# Altium schematic symbol library FPGA_Xilinx_Virtex5.SchLib: 41 symbols (part 6 of 27) (continued)
## XC5VLX30T-FF665 (continued)
part E pins: AA10 IO_L2P_A23_2 (io), AA12 IO_L4N_VREF_FOE_B_MOSI_2 (io), AA13 IO_L6P_D7_2 (io), AA14 IO_L6N_D6_2 (io), AA15 IO_L9N_D0_FS0_2 (io), AA16 VCCO_2 (power), AA17 IO_L5P_FWE_B_2 (io), AA18 IO_L3P_A21_2 (io), AA19 IO_L1N_CC_A24_2 (io), AD17 VCCO_2 (power), D13 IO_L2N_GC_VRP_3 (io), D14 IO_L2P_GC_VRN_3 (io), D15 IO_L0P_CC_GC_3 (io), D16 IO_L1P_CC_GC_3 (io), D17 VCCO_3 (power), D18 IO_L3N_GC_3 (io), E10 IO_L8P_GC_3 (io), E11 IO_L6N_GC_3 (io), E12 IO_L4N_GC_VREF_3 (io), E13 IO_L4P_GC_3 (io), E15 IO_L0N_CC_GC_3 (io), E16 IO_L1N_CC_GC_3 (io), E17 IO_L3P_GC_3 (io), E18 IO_L5P_GC_3 (io), E20 IO_L7P_GC_3 (io), E21 IO_L7N_GC_3 (io), F10 IO_L8N_GC_3 (io), F12 IO_L6P_GC_3 (io), F19 IO_L5N_GC_3 (io), F20 IO_L9P_GC_3 (io), G18 VCCO_3 (power), G21 IO_L9N_GC_3 (io), W11 IO_L0P_CC_RS1_2 (io), W14 IO_L8N_D2_FS2_2 (io), W16 IO_L7N_D4_2 (io), Y10 IO_L0N_CC_RS0_2 (io), Y11 IO_L2N_A22_2 (io), Y12 IO_L4P_FCS_B_2 (io), Y13 IO_L8P_D3_2 (io), Y15 IO_L9P_D1_FS1_2 (io), Y16 IO_L7P_D5_2 (io), Y17 IO_L5N_CSO_B_2 (io), Y18 IO_L3N_A20_2 (io), Y20 IO_L1P_CC_A25_2 (io)
part F pins: AA20 IO_L0N_GC_D14_4 (io), AB10 IO_L1P_GC_D13_4 (io), AB11 IO_L1N_GC_D12_4 (io), AB12 IO_L3N_GC_D8_4 (io), AB13 VCCO_4 (power), AB14 IO_L7P_GC_VRN_4 (io), AB15 IO_L9P_CC_GC_4 (io), AB16 IO_L8N_CC_GC_4 (io), AB17 IO_L6N_GC_4 (io), AB19 IO_L4P_GC_4 (io), AB20 IO_L2N_GC_D10_4 (io), AB21 IO_L2P_GC_D11_4 (io), AC11 IO_L3P_GC_D9_4 (io), AC12 IO_L5P_GC_4 (io), AC13 IO_L5N_GC_4 (io), AC14 IO_L7N_GC_VRP_4 (io), AC16 IO_L9N_CC_GC_4 (io), AC17 IO_L8P_CC_GC_4 (io), AC18 IO_L6P_GC_4 (io), AC19 IO_L4N_GC_VREF_4 (io), AE14 VCCO_4 (power), Y21 IO_L0P_GC_D15_4 (io)
part G pins: H2 MGTTXP0_112 (io), J1 MGTRXP0_112 (io), J2 MGTTXN0_112 (io), K1 MGTRXN0_112 (io), K3 MGTREFCLKN_112 (io), K4 MGTREFCLKP_112 (io), L1 MGTRXN1_112 (io), M1 MGTRXP1_112 (io), M2 MGTTXN1_112 (io), N2 MGTTXP1_112 (io), P2 MGTTXP0_114 (io), R1 MGTRXP0_114 (io), R2 MGTTXN0_114 (io), T1 MGTRXN0_114 (io), T3 MGTREFCLKN_114 (io), T4 MGTREFCLKP_114 (io), U1 MGTRXN1_114 (io), V1 MGTRXP1_114 (io), V2 MGTTXN1_114 (io), W2 MGTTXP1_114 (io)
part H pins: AA1 MGTRXP0_118 (io), AA2 MGTTXN0_118 (io), AB1 MGTRXN0_118 (io), AB3 MGTREFCLKN_118 (io), AB4 MGTREFCLKP_118 (io), AC1 MGTRXN1_118 (io), AD1 MGTRXP1_118 (io), AD2 MGTTXN1_118 (io), AE2 MGTTXP1_118 (io), B2 MGTTXP0_116 (io), C1 MGTRXP0_116 (io), C2 MGTTXN0_116 (io), D1 MGTRXN0_116 (io), D3 MGTREFCLKN_116 (io), D4 MGTREFCLKP_116 (io), E1 MGTRXN1_116 (io), F1 MGTRXP1_116 (io), F2 MGTTXN1_116 (io), G2 MGTTXP1_116 (io), Y2 MGTTXP0_118 (io)
part I pins: AA3 MGTAVTTRX_118 (power), AC3 MGTAVCC_118 (power), AC4 MGTAVCC_118 (power), AD3 MGTAVCCPLL_118 (power), AE3 MGTAVTTTX_118 (power), B3 MGTAVTTTX_116 (power), C3 MGTAVTTRX_116 (power), E3 MGTAVCC_116 (power), E4 MGTAVCC_116 (power), F3 MGTAVCCPLL_116 (power), G3 MGTAVTTTX_116 (power), H3 MGTAVTTTX_112 (power), J3 MGTAVTTRX_112 (power), L3 MGTAVCC_112 (power), L4 MGTAVCC_112 (power), M3 MGTAVCCPLL_112 (power), N3 MGTAVTTTX_112 (power), P3 MGTAVTTTX_114 (power), P4 MGTRREF_112 (power), P5 MGTAVTTRXC (power), R3 MGTAVTTRX_114 (power), U3 MGTAVCC_114 (power), U4 MGTAVCC_114 (power), V3 MGTAVCCPLL_114 (power), W3 MGTAVTTTX_114 (power), Y3 MGTAVTTTX_118 (power)
part J pins: F11 VCCO_0 (power), H12 INIT_B_0 (io), J10 D_IN_0 (io), J11 CCLK_0 (io), J12 VCCO_0 (power), J20 PROGRAM_B_0 (io), K11 DONE_0 (io), K20 HSWAPEN_0 (io), L20 CS_B_0 (io), M20 RDWR_B_0 (io), N14 VREFN_0 (io), N15 VP_0 (io), P14 VN_0 (io), P15 VREFP_0 (io), R14 DXN_0 (io), R15 DXP_0 (io), T20 M0_0 (io), U12 D_OUT_BUSY_0 (io), U20 M2_0 (io), V11 TCK_0 (io), V12 TDO_0 (io), V13 TDI_0 (io), W13 TMS_0 (io), W20 M1_0 (io)
part K pins: A2 GND (power), A6 GND (power), A11 GND (power), A16 GND (power), A21 GND (power), A26 GND (power), AA4 GND (power), AA11 GND (power), AA21 GND (power), AA26 GND (power), AB2 GND (power), AB8 GND (power), AB18 GND (power), AC2 GND (power), AC5 GND (power), AC15 GND (power), AC25 GND (power), AD12 GND (power), AD22 GND (power), AE4 GND (power), AE9 GND (power), AE19 GND (power), AF2 GND (power), AF6 GND (power), AF11 GND (power), AF16 GND (power), AF21 GND (power), AF26 GND (power), B8 GND (power), B18 GND (power), C4 GND (power), C5 GND (power), C15 GND (power), C20 GND (power), C25 GND (power), D2 GND (power), D12 GND (power), D22 GND (power), E2 GND (power), E9 GND (power), E19 GND (power), F4 GND (power), F6 GND (power), F16 GND (power), F26 GND (power), G13 GND (power), G23 GND (power), H10 GND (power), H14 GND (power), H15 VCCINT (power), H16 GND (power), H17 VCCINT (power), H20 GND (power), J4 GND (power), J7 GND (power), J13 GND (power), J14 VCCINT (power), J15 GND (power), J16 VCCINT (power), J17 GND (power), J18 VCCINT (power), J19 VBATT_0 (power), K2 GND (power), K9 VCCAUX (power), K10 GND (power), K12 GND (power), K13 VCCINT (power), K14 GND (power), K15 VCCINT (power), K16 GND (power), K17 VCCINT (power), K18 GND (power), K19 VCCINT (power), K24 GND (power), L2 GND (power), L9 GND (power), L10 VCCINT (power), L11 GND (power), L12 VCCINT (power), L13 GND (power), L14 VCCINT (power), L15 GND (power), L16 VCCINT (power), L17 GND (power), L18 VCCINT (power), L19 GND (power), L21 GND (power), L26 GND (power), M4 GND (power), M8 GND (power), M9 VCCAUX (power), M10 GND (power), M11 VCCINT (power), M12 GND (power), M13 VCCINT (power), M14 AVSS_0 (power), M15 AVDD_0 (power), M16 GND (power), M17 VCCINT (power), M18 GND (power), M19 VCCAUX (power), N5 GND (power), N9 GND (power), N10 VCCINT (power), N11 GND (power), N12 VCCINT (power), N13 GND (power), N16 VCCINT (power), N17 GND (power), N18 VCCINT (power), N19 GND (power), N20 VCCAUX (power), N25 GND (power), P9 VCCAUX (power), P10 GND (power), P11 VCCINT (power), P12 GND (power), P13 VCCINT (power), P16 GND (power), P17 VCCINT (power), P18 GND (power), P19 VCCAUX (power), P22 GND (power), R4 GND (power), R9 GND (power), R10 VCCINT (power), R11 GND (power), R12 VCCINT (power), R13 GND (power), R16 VCCINT (power), R17 GND (power), R18 VCCINT (power), R19 GND (power), T2 GND (power), T6 GND (power), T9 VCCAUX (power), T10 GND (power), T11 VCCINT (power), T12 GND (power), T13 VCCINT (power), T14 GND (power), T15 VCCINT (power), T16 GND (power), T17 VCCINT (power), T18 GND (power), T19 VCCAUX (power), T21 GND (power), T26 GND (power), U2 GND (power), U8 VCCAUX (power), U9 GND (power), U10 VCCINT (power), U11 GND (power), U13 GND (power), U14 VCCINT (power), U15 GND (power), U16 VCCINT (power), U17 GND (power), U18 VCCINT (power), U19 GND (power), U23 GND (power), V4 GND (power), V5 GND (power), V10 GND (power), V14 GND (power), V15 VCCINT (power), V16 GND (power), V17 VCCINT (power), V18 GND (power), V19 VCCAUX (power), V20 GND (power), W7 GND (power), W10 VCCAUX (power), W12 GND (power), W15 GND (power), W17 GND (power), W18 VCCINT (power), W19 GND (power), Y9 GND (power), Y14 GND (power), Y19 VCCAUX (power), Y24 GND (power)

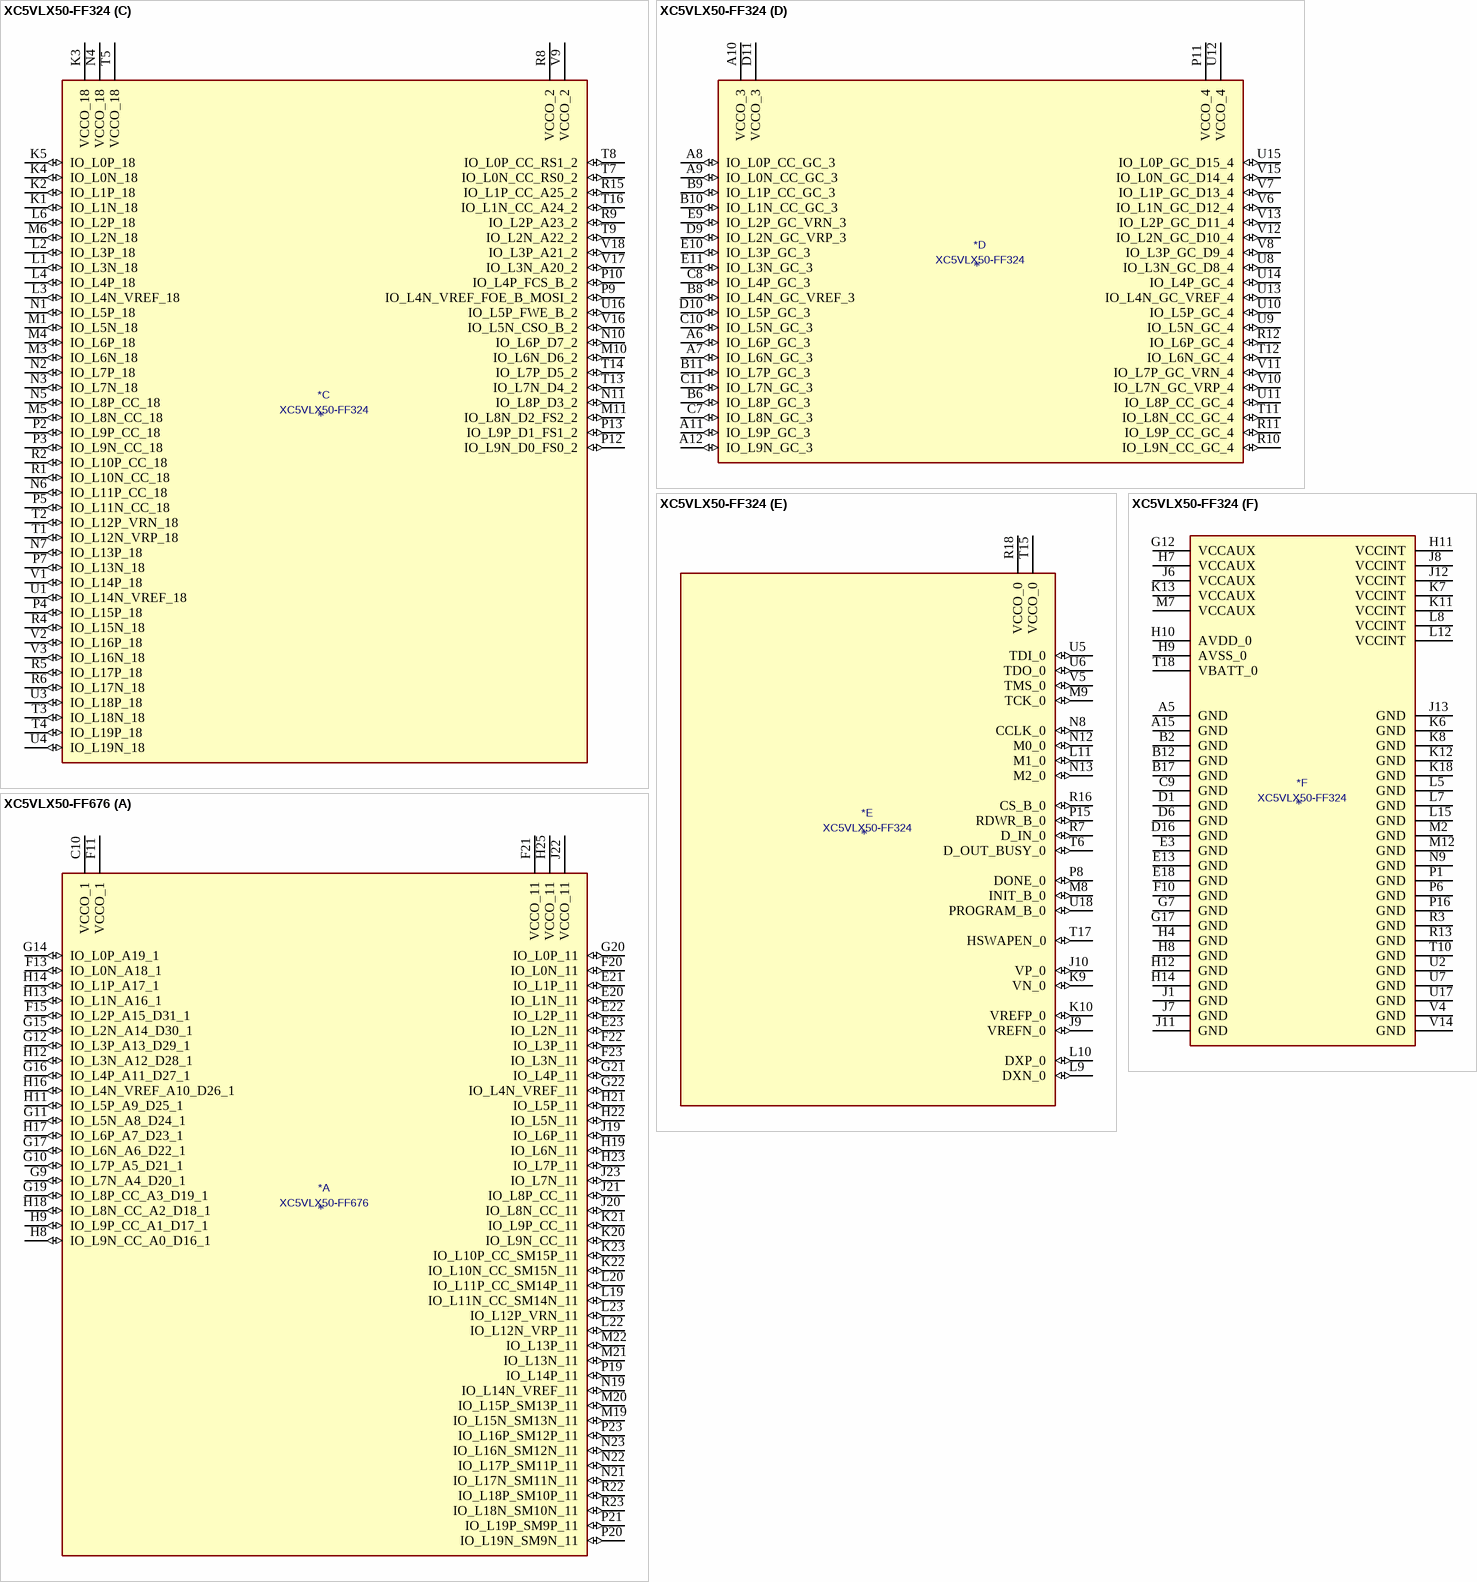
[diagram p35: symbols XC5VLX50-FF324 to XC5VLX50-FF676]

## XC5VLX50-FF324
designator *  value XC5VLX50-FF324
ki_keywords: FPGA; ki_description: Virtex 5 LX 50 XC5VLX50-FF324
part A pins: A13 IO_L1P_11 (io), A14 IO_L1N_11 (io), A16 IO_L3N_11 (io), A17 IO_L5P_11 (io), A18 IO_L5N_11 (io), B7 VCCO_1 (power), B13 IO_L6N_11 (io), B14 IO_L2P_11 (io), B15 IO_L2N_11 (io), B16 IO_L3P_11 (io), B18 IO_L7P_11 (io), C6 IO_L9N_CC_A0_D16_1 (io), C12 IO_L4P_A11_D27_1 (io), C13 IO_L6P_11 (io), C14 VCCO_11 (power), C15 IO_L0P_11 (io), C16 IO_L0N_11 (io), C17 IO_L7N_11 (io), C18 IO_L12N_VRP_11 (io), D7 IO_L9P_CC_A1_D17_1 (io), D8 IO_L7P_A5_D21_1 (io), D12 IO_L2N_A14_D30_1 (io), D13 IO_L4N_VREF_A10_D26_1 (io), D14 IO_L4P_11 (io), D15 IO_L11P_CC_SM14P_11 (io), D17 IO_L10N_CC_SM15N_11 (io), D18 IO_L12P_VRN_11 (io), E7 IO_L7N_A4_D20_1 (io), E8 VCCO_1 (power), E12 IO_L2P_A15_D31_1 (io), E14 IO_L4N_VREF_11 (io), E15 IO_L11N_CC_SM14N_11 (io), E16 IO_L9N_CC_11 (io), E17 IO_L10P_CC_SM15P_11 (io), F7 IO_L5N_A8_D24_1 (io), F8 IO_L3P_A13_D29_1 (io), F9 IO_L1N_A16_1 (io), F11 IO_L0P_A19_1 (io), F12 IO_L6P_A7_D23_1 (io), F13 IO_L6N_A6_D22_1 (io), F14 IO_L8P_CC_11 (io), F15 VCCO_11 (power), F16 IO_L9P_CC_11 (io), F17 IO_L14N_VREF_11 (io), F18 IO_L14P_11 (io), G8 IO_L5P_A9_D25_1 (io), G9 IO_L3N_A12_D28_1 (io), G10 IO_L1P_A17_1 (io), G11 IO_L0N_A18_1 (io), G13 IO_L8P_CC_A3_D19_1 (io), G14 IO_L8N_CC_11 (io), G15 IO_L13N_11 (io), G16 IO_L15N_SM13N_11 (io), G18 IO_L16N_SM12N_11 (io), H13 IO_L8N_CC_A2_D18_1 (io), H15 IO_L13P_11 (io), H16 IO_L15P_SM13P_11 (io), H17 IO_L17P_SM11P_11 (io), H18 IO_L16P_SM12P_11 (io), J14 IO_L19N_SM9N_11 (io), J15 IO_L19P_SM9P_11 (io), J16 VCCO_11 (power), J17 IO_L17N_SM11N_11 (io), J18 IO_L18N_SM10N_11 (io), K17 IO_L18P_SM10P_11 (io)
part B pins: A1 IO_L10P_CC_12 (io), A2 IO_L10N_CC_12 (io), A3 IO_L5P_12 (io), A4 IO_L3N_12 (io), B1 IO_L12N_VRP_12 (io), B3 IO_L5N_12 (io), B4 IO_L3P_12 (io), B5 IO_L1P_12 (io), C1 IO_L12P_VRN_12 (io), C2 IO_L9N_CC_12 (io), C3 IO_L7P_12 (io), C4 VCCO_12 (power), C5 IO_L1N_12 (io), D2 IO_L9P_CC_12 (io), D3 IO_L7N_12 (io), D4 IO_L2N_12 (io), D5 IO_L2P_12 (io), E1 IO_L14N_VREF_12 (io), E2 IO_L18P_12 (io), E4 IO_L4N_VREF_12 (io), E5 IO_L4P_12 (io), E6 IO_L0P_12 (io), F1 IO_L14P_12 (io), F2 IO_L18N_12 (io), F3 IO_L13N_12 (io), F4 IO_L11N_CC_12 (io), F5 VCCO_12 (power), F6 IO_L0N_12 (io), G1 IO_L19P_12 (io), G2 VCCO_12 (power), G3 IO_L13P_12 (io), G4 IO_L11P_CC_12 (io), G5 IO_L6P_12 (io), G6 IO_L6N_12 (io), H1 IO_L19N_12 (io), H2 IO_L17P_12 (io), H3 IO_L16P_12 (io), H5 IO_L8N_CC_12 (io), H6 IO_L8P_CC_12 (io), J2 IO_L17N_12 (io), J3 IO_L16N_12 (io), J4 IO_L15N_12 (io), J5 IO_L15P_12 (io), K14 IO_L2P_SM6P_13 (io), K15 IO_L0P_SM8P_13 (io), K16 IO_L1N_SM7N_13 (io), L13 IO_L4P_13 (io), L14 IO_L2N_SM6N_13 (io), L16 IO_L0N_SM8N_13 (io), L17 IO_L1P_SM7P_13 (io), L18 IO_L3N_SM5N_13 (io), M13 IO_L4N_VREF_13 (io), M14 IO_L6P_SM3P_13 (io), M15 IO_L8P_CC_SM1P_13 (io), M16 IO_L8N_CC_SM1N_13 (io), M17 VCCO_13 (power), M18 IO_L3P_SM5P_13 (io), N14 VCCO_13 (power), N15 IO_L6N_SM3N_13 (io), N16 IO_L9P_CC_SM0P_13 (io), N17 IO_L9N_CC_SM0N_13 (io), N18 IO_L5N_SM4N_13 (io), P17 IO_L7P_SM2P_13 (io), P18 IO_L5P_SM4P_13 (io), R17 IO_L7N_SM2N_13 (io)
part C pins: K1 IO_L1N_18 (io), K2 IO_L1P_18 (io), K3 VCCO_18 (power), K4 IO_L0N_18 (io), K5 IO_L0P_18 (io), L1 IO_L3N_18 (io), L2 IO_L3P_18 (io), L3 IO_L4N_VREF_18 (io), L4 IO_L4P_18 (io), L6 IO_L2P_18 (io), M1 IO_L5N_18 (io), M3 IO_L6N_18 (io), M4 IO_L6P_18 (io), M5 IO_L8N_CC_18 (io), M6 IO_L2N_18 (io), M10 IO_L6N_D6_2 (io), M11 IO_L8N_D2_FS2_2 (io), N1 IO_L5P_18 (io), N2 IO_L7P_18 (io), N3 IO_L7N_18 (io), N4 VCCO_18 (power), N5 IO_L8P_CC_18 (io), N6 IO_L11P_CC_18 (io), N7 IO_L13P_18 (io), N10 IO_L6P_D7_2 (io), N11 IO_L8P_D3_2 (io), P2 IO_L9P_CC_18 (io), P3 IO_L9N_CC_18 (io), P4 IO_L15P_18 (io), P5 IO_L11N_CC_18 (io), P7 IO_L13N_18 (io), P9 IO_L4N_VREF_FOE_B_MOSI_2 (io), P10 IO_L4P_FCS_B_2 (io), P12 IO_L9N_D0_FS0_2 (io), P13 IO_L9P_D1_FS1_2 (io), R1 IO_L10N_CC_18 (io), R2 IO_L10P_CC_18 (io), R4 IO_L15N_18 (io), R5 IO_L17P_18 (io), R6 IO_L17N_18 (io), R8 VCCO_2 (power), R9 IO_L2P_A23_2 (io), R15 IO_L1P_CC_A25_2 (io), T1 IO_L12N_VRP_18 (io), T2 IO_L12P_VRN_18 (io), T3 IO_L18N_18 (io), T4 IO_L19P_18 (io), T5 VCCO_18 (power), T7 IO_L0N_CC_RS0_2 (io), T8 IO_L0P_CC_RS1_2 (io), T9 IO_L2N_A22_2 (io), T13 IO_L7N_D4_2 (io), T14 IO_L7P_D5_2 (io), T16 IO_L1N_CC_A24_2 (io), U1 IO_L14N_VREF_18 (io), U3 IO_L18P_18 (io), U4 IO_L19N_18 (io), U16 IO_L5P_FWE_B_2 (io), V1 IO_L14P_18 (io), V2 IO_L16P_18 (io), V3 IO_L16N_18 (io), V9 VCCO_2 (power), V16 IO_L5N_CSO_B_2 (io), V17 IO_L3N_A20_2 (io), V18 IO_L3P_A21_2 (io)
part D pins: A6 IO_L6P_GC_3 (io), A7 IO_L6N_GC_3 (io), A8 IO_L0P_CC_GC_3 (io), A9 IO_L0N_CC_GC_3 (io), A10 VCCO_3 (power), A11 IO_L9P_GC_3 (io), A12 IO_L9N_GC_3 (io), B6 IO_L8P_GC_3 (io), B8 IO_L4N_GC_VREF_3 (io), B9 IO_L1P_CC_GC_3 (io), B10 IO_L1N_CC_GC_3 (io), B11 IO_L7P_GC_3 (io), C7 IO_L8N_GC_3 (io), C8 IO_L4P_GC_3 (io), C10 IO_L5N_GC_3 (io), C11 IO_L7N_GC_3 (io), D9 IO_L2N_GC_VRP_3 (io), D10 IO_L5P_GC_3 (io), D11 VCCO_3 (power), E9 IO_L2P_GC_VRN_3 (io), E10 IO_L3P_GC_3 (io), E11 IO_L3N_GC_3 (io), P11 VCCO_4 (power), R10 IO_L9N_CC_GC_4 (io), R11 IO_L9P_CC_GC_4 (io), R12 IO_L6P_GC_4 (io), T11 IO_L8N_CC_GC_4 (io), T12 IO_L6N_GC_4 (io), U8 IO_L3N_GC_D8_4 (io), U9 IO_L5N_GC_4 (io), U10 IO_L5P_GC_4 (io), U11 IO_L8P_CC_GC_4 (io), U12 VCCO_4 (power), U13 IO_L4N_GC_VREF_4 (io), U14 IO_L4P_GC_4 (io), U15 IO_L0P_GC_D15_4 (io), V6 IO_L1N_GC_D12_4 (io), V7 IO_L1P_GC_D13_4 (io), V8 IO_L3P_GC_D9_4 (io), V10 IO_L7N_GC_VRP_4 (io), V11 IO_L7P_GC_VRN_4 (io), V12 IO_L2N_GC_D10_4 (io), V13 IO_L2P_GC_D11_4 (io), V15 IO_L0N_GC_D14_4 (io)
part E pins: J9 VREFN_0 (io), J10 VP_0 (io), K9 VN_0 (io), K10 VREFP_0 (io), L9 DXN_0 (io), L10 DXP_0 (io), L11 M1_0 (io), M8 INIT_B_0 (io), M9 TCK_0 (io), N8 CCLK_0 (io), N12 M0_0 (io), N13 M2_0 (io), P8 DONE_0 (io), P15 RDWR_B_0 (io), R7 D_IN_0 (io), R16 CS_B_0 (io), R18 VCCO_0 (power), T6 D_OUT_BUSY_0 (io), T15 VCCO_0 (power), T17 HSWAPEN_0 (io), U5 TDI_0 (io), U6 TDO_0 (io), U18 PROGRAM_B_0 (io), V5 TMS_0 (io)
part F pins: A5 GND (power), A15 GND (power), B2 GND (power), B12 GND (power), B17 GND (power), C9 GND (power), D1 GND (power), D6 GND (power), D16 GND (power), E3 GND (power), E13 GND (power), E18 GND (power), F10 GND (power), G7 GND (power), G12 VCCAUX (power), G17 GND (power), H4 GND (power), H7 VCCAUX (power), H8 GND (power), H9 AVSS_0 (power), H10 AVDD_0 (power), H11 VCCINT (power), H12 GND (power), H14 GND (power), J1 GND (power), J6 VCCAUX (power), J7 GND (power), J8 VCCINT (power), J11 GND (power), J12 VCCINT (power), J13 GND (power), K6 GND (power), K7 VCCINT (power), K8 GND (power), K11 VCCINT (power), K12 GND (power), K13 VCCAUX (power), K18 GND (power), L5 GND (power), L7 GND (power), L8 VCCINT (power), L12 VCCINT (power), L15 GND (power), M2 GND (power), M7 VCCAUX (power), M12 GND (power), N9 GND (power), P1 GND (power), P6 GND (power), P16 GND (power), R3 GND (power), R13 GND (power), T10 GND (power), T18 VBATT_0 (power), U2 GND (power), U7 GND (power), U17 GND (power), V4 GND (power), V14 GND (power)

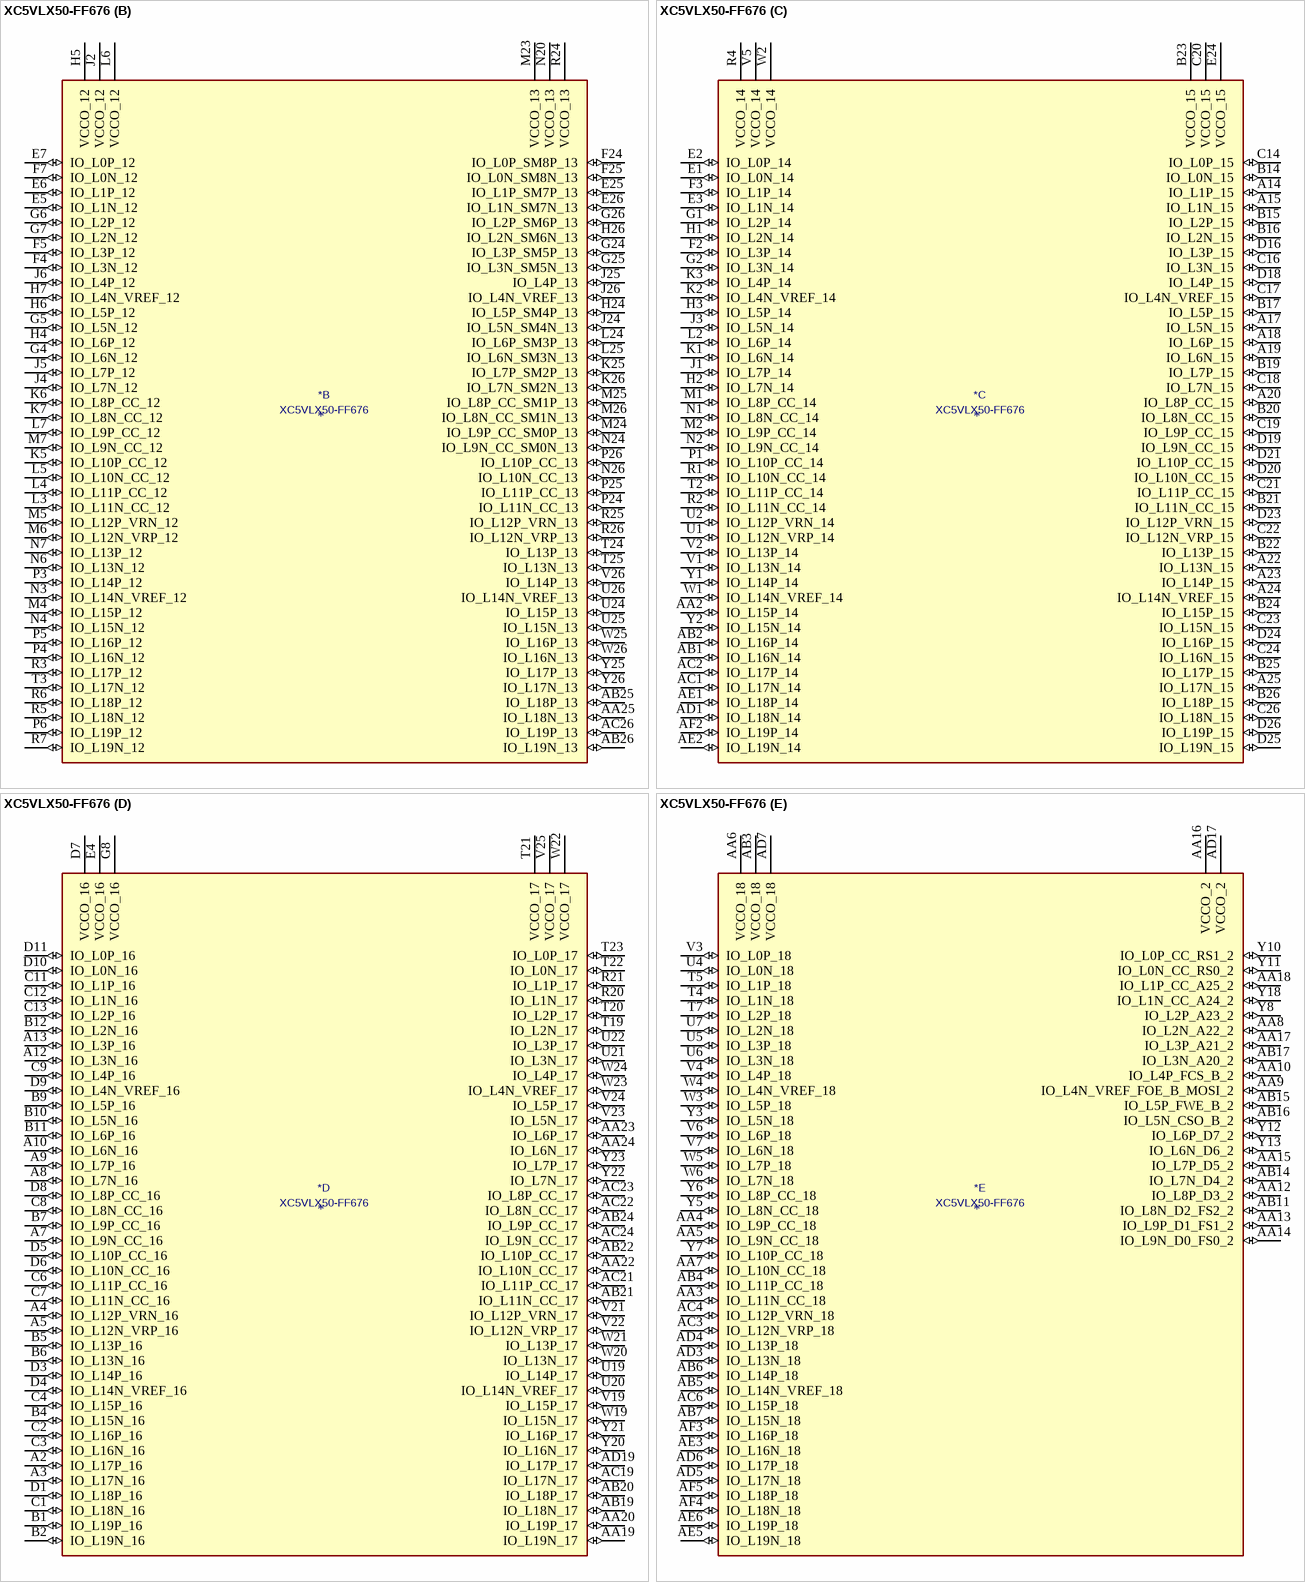
[diagram p36: symbol XC5VLX50-FF676]

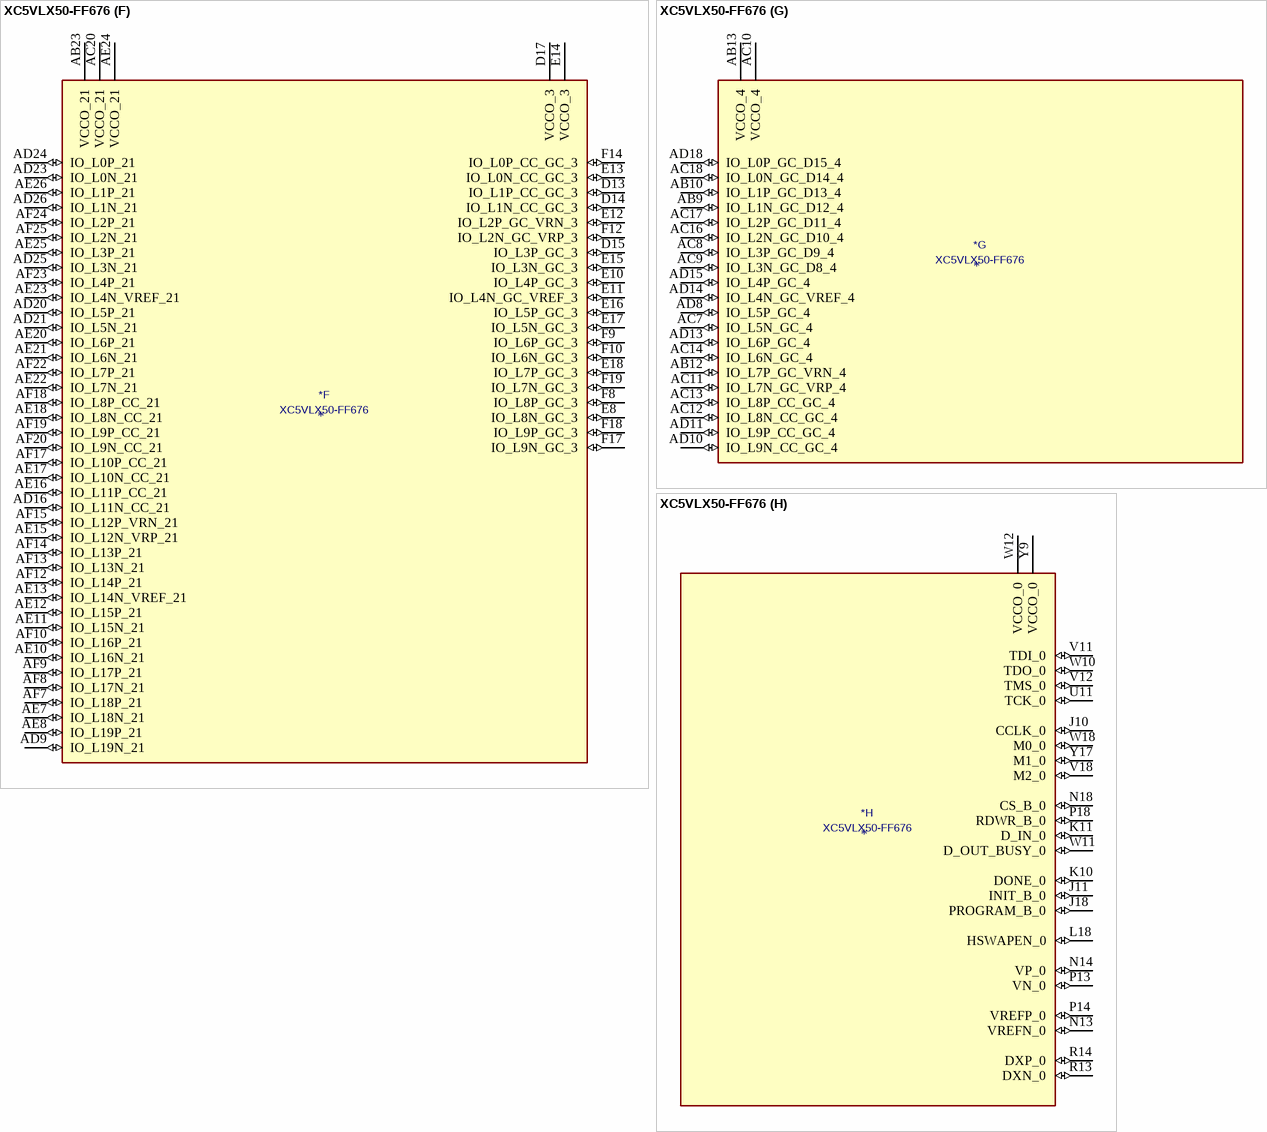
[diagram p37: symbol XC5VLX50-FF676]

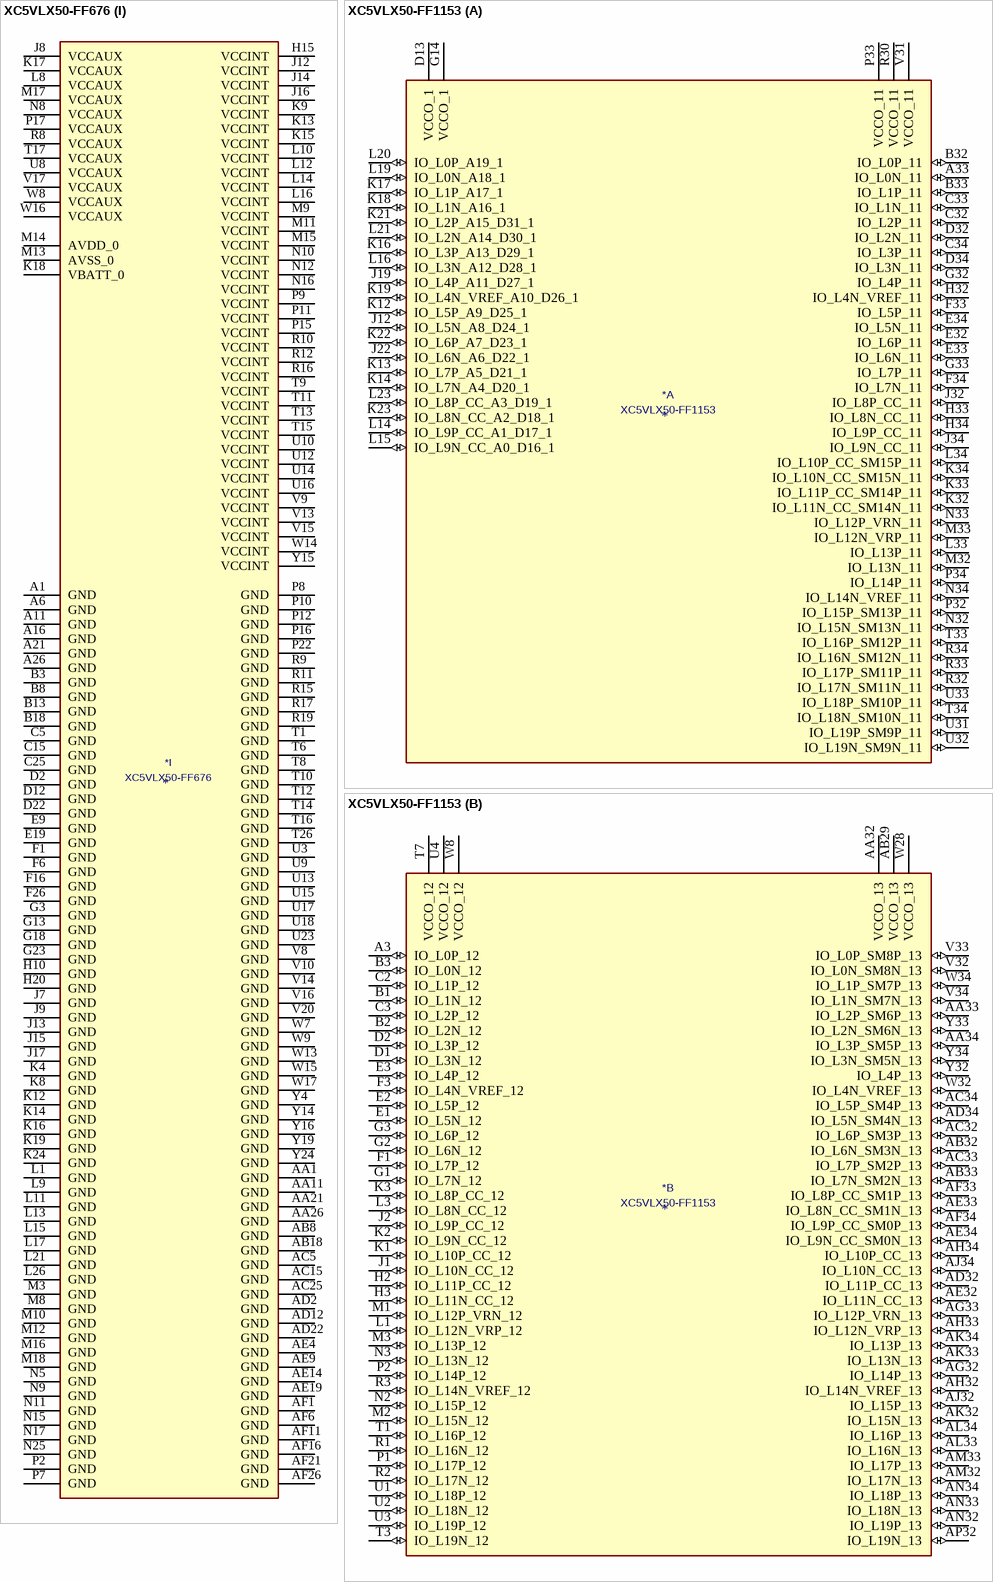
[diagram p38: symbols XC5VLX50-FF676 to XC5VLX50-FF1153]